# Altium footprint library modules.PcbLib: 20 footprints (part 1 of 2)
Each footprint in its own frame and in the unit in brackets; x right, y up, seen from the top. Pads: shape width x height; smd on the part's side, far side on the other; paste and mask are expansions set on the pad; w line width, h text height; cw(c..) or ccw(c..) is an arc to the next point about the centre after c.
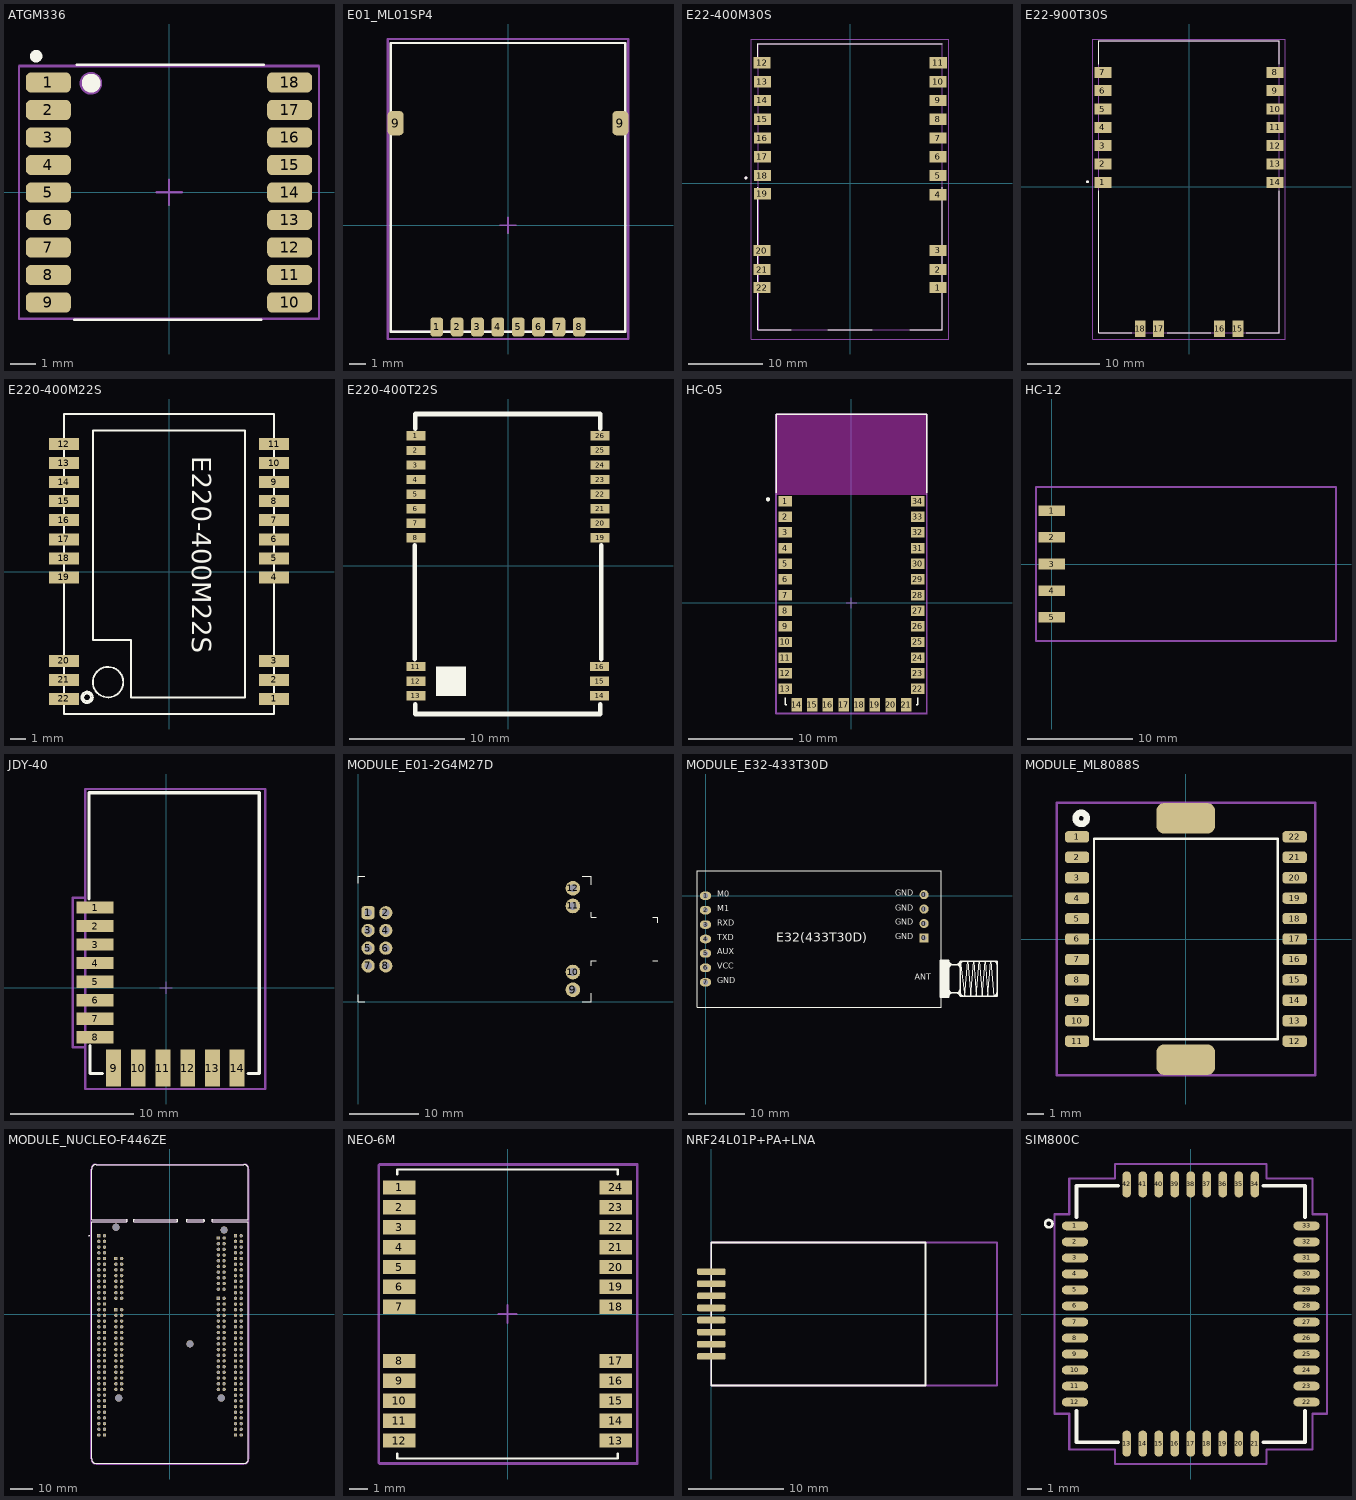
[diagram p0: the footprints below, top view; thin cyan lines are the x and y axes]

## ATGM336 [mm] "PQFN, 18-Leads, Body 9,70x10,10mm, Pitch 1,10mm, IPC Low Density"
height 2.6
pads (18):
  rrect50% 1.8x0.8 smd: 1(-4.825,4.4) 2(-4.825,3.3) 3(-4.825,2.2) 4(-4.825,1.1) 5(-4.825,0) 6(-4.825,-1.1) 7(-4.825,-2.2) 8(-4.825,-3.3) 9(-4.825,-4.4) 10(4.825,-4.4) 11(4.825,-3.3) 12(4.825,-2.2) 13(4.825,-1.1) 14(4.825,0) 15(4.825,1.1) 16(4.825,2.2) 17(4.825,3.3) 18(4.825,4.4)
Top Overlay:
  circle w0.25: c-5.315,5.45 r0.125
  circle w0.5: c-3.113,4.371 r0.125
  lines w0.1: -3.8,-5.1 3.7,-5.1 ; -3.7,5.1 3.8,5.1
Top Assembly (Mech13):
  circle w0.5: c-3.124,4.366 r0.2
  lines w0.1: -0.5,0 0.5,0 ; 0,-0.5 0,0.5 ; -6,-5.05 -6,5.05 6,5.05 6,-5.05 -6,-5.05
Top Courtyard (Mech15):
  lines w0.05: -6,-5.05 -6,5.1 6,5.1 6,-5.05 -6,-5.05
3D body "ATGM336H.stp": height 2.6, standoff 0, extent -4.85,-5.05 4.85,5.05

## E01_ML01SP4 [mm]
pads (10):
  rrect50% 0.8x1.2 smd mask+0: 1(-4.445,-6.35) 2(-3.175,-6.35) 3(-1.905,-6.35) 4(-0.635,-6.35) 5(0.635,-6.35) 6(1.905,-6.35) 7(3.175,-6.35) 8(4.445,-6.35)
  rrect50% 1x1.5 smd mask+0: 9(-7,6.35) 9(7,6.35)
Top Overlay:
  lines w0.15: -7.3,-6.65 7.3,-6.65 7.3,11.35 -7.3,11.35 -7.3,-6.65
Top Assembly (Mech13):
  lines w0.1: -0.5,0 0.5,0 ; 0,-0.5 0,0.5
  lines w0.15: -7.3,-6.65 7.3,-6.65 7.3,11.35 -7.3,11.35 -7.3,-6.65
Top Courtyard (Mech15):
  lines w0.15: -7.5,-7.1 7.5,-7.1 7.5,11.6 -7.5,11.6 -7.5,-7.1

## E22-400M30S [mm]
pads (22):
  rect 2.31x1.51 smd: 1(11.92,-14.15) 2(11.92,-11.72) 3(11.9,-9.11) 20(-11.94,-9.13) 21(-11.91,-11.7) 22(-11.91,-14.15)
  rect 2.34x1.53 smd: 4(11.905,-1.58) 5(11.905,1.02) 6(11.905,3.56) 7(11.905,6.1) 8(11.905,8.64) 9(11.905,11.18) 10(11.905,13.72) 11(11.915,16.29) 12(-11.915,16.29) 13(-11.865,13.72) 14(-11.865,11.18) 15(-11.865,8.64) 16(-11.865,6.1) 17(-11.865,3.56) 18(-11.865,1.02) 19(-11.865,-1.45)
Top Overlay:
  circle w0.2: c-14.1,0.7 r0.1
  lines w0.127: -12.5,-0.55 -12.5,-19.85 -7.95,-19.85 ; -12.5,17 -12.5,18.85 12.5,18.85 ; -3,-19.85 3,-19.85 ; 8.05,-19.85 12.5,-19.85 12.5,-0.55
Top Assembly (Mech13):
  circle w0.2: c-14.1,0.7 r0.1
  lines w0.127: -12.5,18.85 -12.4,-19.85 12.5,-19.85 12.5,18.85 -12.5,18.85
Top Courtyard (Mech15):
  lines w0.05: -13.36,-21.105 -13.36,19.5 13.36,19.5 13.36,-21.105 -13.36,-21.105

## E22-900T30S [mm]
pads (18):
  rect 2.34x1.53 smd: 1(-11.935,0.63) 2(-11.935,3.17) 3(-11.935,5.71) 4(-11.935,8.25) 5(-11.935,10.79) 6(-11.935,13.33) 7(-11.935,15.87) 8(11.935,15.87) 9(11.935,13.33) 10(11.935,10.79) 11(11.935,8.25) 12(11.935,5.71) 13(11.935,3.17) 14(11.935,0.63)
  rect 1.51x2.31 smd: 15(6.77,-19.7) 16(4.23,-19.7) 17(-4.23,-19.7) 18(-6.77,-19.7)
Top Overlay:
  circle w0.2: c-14.1,0.7 r0.1
  lines w0.127: -12.5,-0.55 -12.5,-20.25 -7.95,-20.25 ; -12.5,17 -12.5,20.25 12.5,20.25 12.5,17 ; -3,-20.25 3,-20.25 ; 7.95,-20.25 12.5,-20.25 12.5,-0.55
Top Assembly (Mech13):
  circle w0.2: c-14.1,0.7 r0.1
  lines w0.127: -12.5,-20.25 12.5,-20.25 12.5,20.25 -12.5,20.25 -12.5,-20.25
Top Courtyard (Mech15):
  lines w0.05: -13.36,-21.105 13.36,-21.105 13.36,20.5 -13.36,20.5 -13.36,-21.105
3D body "User Library-E32_XXXT30S Ebyte.STEP": height 3.83, standoff -0.02, extent -12.5,-20.25 12.5,20.25

## E220-400M22S [mm]
pads (22):
  rect 2x0.8 smd: 1(7,-8.5) 2(7,-7.23) 3(7,-5.96) 4(7,-0.39) 5(7,0.88) 6(7,2.15) 7(7,3.42) 8(7,4.69) 9(7,5.96) 10(7,7.23) 11(7,8.5) 12(-7,8.5) 13(-7,7.23) 14(-7,5.96) 15(-7,4.69) 16(-7,3.42) 17(-7,2.15) 18(-7,0.88) 19(-7,-0.39) 20(-7,-5.96) 21(-7,-7.23) 22(-7,-8.5)
Top Overlay:
  circle w0.127: c-4.064,-7.374 r1.016
  circle w0.127: c-5.461,-8.39 r0.381
  circle w0.127: c-5.461,-8.39 r0.254
  lines w0.127: -7,-9.5 7,-9.5 7,10.5 -7,10.5 -7,-9.5 ; -5.08,-4.58 -2.54,-4.58 -2.54,-8.39 5.08,-8.39 5.08,9.39 -5.08,9.39 -5.08,-4.58
  text "E220-400M22S" at 1.538,7.678 h1.27

## E220-400T22S [mil]
pads (22):
  rect 66x32 smd: 1(-315.94,445.81) 2(-315.94,395.81) 3(-315.94,345.81) 4(-315.94,295.81) 5(-315.94,245.81) 6(-315.94,195.81) 7(-315.94,145.81) 8(-315.94,95.81) 11(-315.83,-345.81) 12(-315.83,-395.81) 13(-315.83,-445.81) 14(314.17,-445.81) 15(314.17,-395.81) 16(314.17,-345.81) 19(315.94,95.81) 20(315.94,145.81) 21(315.94,195.81) 22(315.94,245.81) 23(315.94,295.81) 24(315.94,345.81) 25(315.94,395.81) 26(315.94,445.81)
Top Overlay:
  region: -245.83,-345.81 -145.83,-345.81 -145.83,-445.81 -245.83,-445.81
  lines w15.75: -320,-320 -320,70 ; -318.78,-475.81 -318.78,-508.59 316.6,-508.59 316.6,-475.81 ; -318.52,470 -318.52,520.82 316.96,520.82 316.96,469.63 ; 320,-320 320,70
3D body "User Library-E22-900T22.STEP": height 124.41, standoff -0.39, extent -312.91,-499.45 317.01,524.18

## HC-05 [mm]
pads (34):
  rect 1.3x1 smd: 1(-6.35,9.75) 2(-6.35,8.25) 3(-6.35,6.75) 4(-6.35,5.25) 5(-6.35,3.75) 6(-6.35,2.25) 7(-6.35,0.75) 8(-6.35,-0.75) 9(-6.35,-2.25) 10(-6.35,-3.75) 11(-6.35,-5.25) 12(-6.35,-6.75) 13(-6.35,-8.25) 22(6.35,-8.25) 23(6.35,-6.75) 24(6.35,-5.25) 25(6.35,-3.75) 26(6.35,-2.25) 27(6.35,-0.75) 28(6.35,0.75) 29(6.35,2.25) 30(6.35,3.75) 31(6.35,5.25) 32(6.35,6.75) 33(6.35,8.25) 34(6.35,9.75)
  rect 1x1.3 smd: 14(-5.25,-9.75) 15(-3.75,-9.75) 16(-2.25,-9.75) 17(-0.75,-9.75) 18(0.75,-9.75) 19(2.25,-9.75) 20(3.75,-9.75) 21(5.25,-9.75)
Top Overlay:
  circle w0.2: c-8,9.925 r0.1
  lines w0.127: -7.2,10.57 -7.2,18.1 7.2,18.1 7.2,10.57 ; -6.35,-9.07 -6.35,-9.75 -6.22,-9.75 ; 6.22,-9.75 6.35,-9.75 6.35,-9.07
Keep-Out Layer:
  region: 6.35,10.375 -6.35,10.375 -6.35,17.275 6.35,17.275
  region: 6.35,10.375 -6.35,10.375 -6.35,17.275 6.35,17.275
  region: 7.2,10.375 -7.2,10.375 -7.2,18.1 7.2,18.1
Top Assembly (Mech13):
  lines w0.1: -0.5,0 0.5,0 ; 0,-0.5 0,0.5
  lines w0.127: -7.2,-10.6 -7.2,18.1 7.2,18.1 7.2,-10.6 -7.2,-10.6
Top Courtyard (Mech15):
  lines w0.1: -7.25,-10.65 -7.25,18.1 7.25,18.1 7.25,-10.65 -7.25,-10.65
3D body "User Library-Bluetooth HC-06_.STEP": height 2.35, standoff 0, extent -7.01,-10.025 7.01,17.985

## HC-12 [mm]
pads (5):
  rect 2.5x1 smd: 1(0,5.08) 2(0,2.54) 3(0,0) 4(0,-2.54) 5(0,-5.08)
Top Assembly (Mech13):
  lines w0.1: -0.5,0 0.5,0 ; 0,-0.5 0,0.5
  lines w0.2: -1.5,-7.3 27,-7.3 27,7.3 -1.5,7.3 -1.5,-7.3
Top Courtyard (Mech15):
  lines w0.2: -1.5,-7.3 -1.5,7.3 27,7.3 27,-7.3 -1.5,-7.3
3D body: height 2, standoff 0, extent -0.762,-7.3 27,7.3

## JDY-40 [mm]
pads (14):
  rect 3x1 smd: 1(-5.75,6.5) 2(-5.75,5) 3(-5.75,3.5) 4(-5.75,2) 5(-5.75,0.5) 6(-5.75,-1) 7(-5.75,-2.5) 8(-5.75,-4)
  rect 1.2x3 smd: 9(-4.25,-6.5) 10(-2.25,-6.5) 11(-0.25,-6.5) 12(1.75,-6.5) 13(3.75,-6.5) 14(5.75,-6.5)
Top Overlay:
  lines w0.254: -6.25,7.2 -6.25,15.8 7.55,15.8 7.55,-6.95 6.65,-6.95 ; -6.15,-4.7 -6.15,-6.95 ; -5.15,-6.95 -6.15,-6.95 ; -6.15,-6.95 -6.15,-6.95
Top Assembly (Mech13):
  lines w0.1: -0.5,0 0.5,0 ; 0,-0.5 0,0.5
  lines w0.2: -6.558,-8.2 8.042,-8.2 8.042,16.1 -6.558,16.1 -6.558,-8.2
Top Courtyard (Mech15):
  lines w0.2: -7.57,-4.8 -7.57,7.3 -6.558,7.3 -6.558,16.1 8.042,16.1 8.042,-8.2 -6.558,-8.2 -6.558,-4.8 -7.57,-4.8
3D body "JDY-40.stp": height 1.1, standoff 0, extent -6.15,-7.05 7.55,16.05

## MODULE_E01-2G4M27D [mm]
height 8
pads (12):
  rrect50% 1.9x1.9 hole 1.1: 1(1.45,12.77)
  round 1.9 hole 1.1: 2(3.99,12.77) 3(1.45,10.23) 4(3.99,10.23) 5(1.45,7.69) 6(3.99,7.69) 7(1.45,5.15) 8(3.99,5.15)
  round 2.1 hole 1.1: 9(30.8,1.725) 10(30.8,4.265) 11(30.8,13.735) 12(30.8,16.275)
Top Overlay:
  lines w0.152: 0,1 0,0 1,0 ; 0,17 0,18 1,18 ; 32.15,0 33.4,0 33.4,1.25 ; 32.15,18 33.4,18 33.4,16.75 ; 33.4,5.15 33.4,5.9 34.15,5.9 ; 33.4,12.85 33.4,12.1 34.15,12.1 ; 42.25,5.9 43,5.9 ; 42.25,12.1 43,12.1 43,11.35
3D body: height 4.01, standoff 2.99, extent 30.006,15.477 31.6,17.074
3D body: height 4.01, standoff 2.99, extent 30.006,12.937 31.6,14.534
3D body: height 4.01, standoff 2.99, extent 30.006,3.467 31.6,5.064
3D body: height 4.01, standoff 2.99, extent 30.006,0.927 31.6,2.524
3D body: height 4.01, standoff 2.99, extent 3.196,6.892 4.79,8.489
3D body: height 4.01, standoff 2.99, extent 3.196,9.432 4.79,11.029
3D body: height 4.01, standoff 2.99, extent 3.206,11.972 4.8,13.569
3D body: height 4.01, standoff 2.99, extent 0.656,11.972 2.25,13.569
3D body: height 4.01, standoff 2.99, extent 0.656,9.432 2.25,11.029
3D body: height 4.01, standoff 2.99, extent 0.656,6.892 2.25,8.489
3D body: height 4.01, standoff 2.99, extent 3.196,4.352 4.79,5.949
3D body: height 4.01, standoff 2.99, extent 0.656,4.352 2.25,5.949
3D body: height 5, standoff -1, extent 30.55,16.025 31.05,16.525
3D body: height 5, standoff -1, extent 30.55,13.485 31.05,13.985
3D body: height 5, standoff -1, extent 30.55,4.015 31.05,4.515
3D body: height 5, standoff -1, extent 30.55,1.475 31.05,1.975
3D body: height 5, standoff -1, extent 1.2,12.52 1.7,13.02
3D body: height 5, standoff -1, extent 3.74,12.52 4.24,13.02
3D body: height 5, standoff -1, extent 3.74,9.98 4.24,10.48
3D body: height 5, standoff -1, extent 1.2,9.98 1.7,10.48
3D body: height 5, standoff -1, extent 1.2,7.44 1.7,7.94
3D body: height 5, standoff -1, extent 3.74,7.44 4.24,7.94
3D body: height 5, standoff -1, extent 3.74,4.9 4.24,5.4
3D body: height 5, standoff -1, extent 1.2,4.9 1.7,5.4
3D body "wireless Module.stp": height 6.65, standoff -3.4, extent 0.054,-0.073 43.104,17.977

## MODULE_E32-433T30D [mm] "43MM*24mm-D//SMAі¤¶И12.5mm"
pads (11):
  rect 1.6x1.6 hole 0.9: 0(38.5,-7.43)
  round 1.6 hole 0.9: 0(38.5,-4.89) 0(38.5,-2.35) 0(38.5,0.19)
  oval 2x1.5 hole 0.9: 1(0,0) 2(0,-2.54) 3(0,-5.08) 4(0,-7.62) 5(0,-10.16) 6(0,-12.7) 7(0,-15.24)
Top Overlay:
  rectangle: 41.35,-17.87 42.85,-11.37
  lines w0.1: 45.7,-17.72 46.22,-11.52 ; 45.7,-17.72 44.85,-11.52 45.7,-17.72 ; 45.7,-17.72 46.22,-11.52 ; 46.22,-11.52 46.73,-17.72 ; 46.22,-11.52 46.73,-17.72 ; 46.73,-17.72 47.24,-11.52 ; 46.73,-17.72 47.24,-11.52 ; 47.24,-11.52 47.72,-17.72 ; 47.24,-11.52 47.72,-17.72 ; 47.72,-17.72 48.24,-11.52 ; 47.72,-17.72 48.24,-11.52 ; 48.24,-11.52 48.75,-17.72 ; 48.24,-11.52 48.75,-17.72 ; 48.75,-17.72 49.24,-11.52 ; 48.75,-17.72 49.24,-11.52 ; 49.24,-11.52 49.76,-17.72 ; 49.24,-11.52 49.76,-17.72 ; 49.76,-17.72 50.28,-11.52 ; 49.76,-17.72 50.28,-11.52 ; 50.28,-11.52 50.79,-17.72 50.28,-11.52 ; -1.5,-19.62 41.5,-19.62 41.5,4.38 -1.5,4.38 -1.5,-19.62
  lines w0.254: 41.35,-17.87 42.85,-17.87 ; 41.35,-17.87 41.35,-11.37 ; 41.35,-17.87 42.85,-17.87 ; 41.35,-17.87 41.35,-11.37 ; 41.35,-11.37 42.85,-11.37 ; 41.35,-11.37 42.85,-11.37 ; 42.85,-17.87 42.85,-11.37 ; 42.85,-17.87 42.85,-11.37 ; 42.85,-16.47 ccw(c43.5,-16.47) 43.5,-17.12 ; 42.85,-16.47 ccw(c43.5,-16.47) 43.5,-17.12 ; 42.85,-16.47 42.85,-16.1 42.85,-16.47 ; 42.85,-12.82 cw(c43.55,-12.82) 43.55,-12.12 ; 42.85,-12.82 cw(c43.55,-12.82) 43.55,-12.12 ; 42.85,-12.82 42.85,-13.74 42.85,-12.82 ; 42.85,-11.49 ccw(c43.48,-11.49) 43.48,-12.12 ; 42.85,-11.49 ccw(c43.48,-11.49) 43.48,-12.12 ; 42.85,-11.49 42.85,-11.37 ; 42.85,-11.49 42.85,-11.37 ; 43.4,-17.12 ccw(c43.4,-17.67) 42.85,-17.67 cw(c43.4,-17.67) 43.4,-17.12 ; 43.4,-17.12 44.25,-17.12 ; 43.4,-17.12 44.25,-17.12 ; 43.48,-12.12 44.25,-12.12 ; 43.48,-12.12 44.25,-12.12 ; 43.5,-17.12 44.22,-17.12 ; 43.5,-17.12 44.22,-17.12 ; 43.55,-12.12 44.25,-12.12 ; 43.55,-12.12 44.25,-12.12 ; 44.22,-17.12 ccw(c44.22,-16.49) 44.85,-16.49 cw(c44.22,-16.49) 44.22,-17.12 ; 44.25,-17.12 cw(c44.25,-17.72) 44.85,-17.72 ; 44.25,-17.12 cw(c44.25,-17.72) 44.85,-17.72 ; 44.25,-12.12 cw(c44.25,-12.72) 44.85,-12.72 ccw(c44.25,-12.72) 44.25,-12.12 ; 44.25,-12.12 ccw(c44.25,-11.52) 44.85,-11.52 ; 44.25,-12.12 ccw(c44.25,-11.52) 44.85,-11.52 ; 44.85,-17.72 44.85,-11.52 ; 44.85,-17.72 51.35,-17.72 ; 44.85,-17.72 44.85,-11.52 ; 44.85,-17.72 51.35,-17.72 ; 44.85,-11.52 51.35,-11.52 ; 44.85,-11.52 51.35,-11.52 ; 45.53,-17.72 cw(c45.53,-17.04) 44.85,-17.04 ccw(c45.53,-17.04) 45.53,-17.72 ; 45.53,-17.72 45.68,-17.72 45.53,-17.72 ; 50.73,-17.72 ccw(c50.73,-17.1) 51.35,-17.1 cw(c50.73,-17.1) 50.73,-17.72 ; 50.73,-17.72 50.5,-17.72 50.73,-17.72 ; 50.81,-11.52 cw(c50.81,-12.06) 51.35,-12.06 ccw(c50.81,-12.06) 50.81,-11.52 ; 50.81,-11.52 50.41,-11.52 50.81,-11.52 ; 51.35,-17.72 51.35,-11.52 ; 51.35,-17.72 51.35,-11.52 ; 42.68,-17.12 44.85,-17.12 42.68,-17.12 ; 42.85,-12.12 44.85,-12.12 42.85,-12.12 ; 44.85,-12.13 cw(c45.46,-12.13) 45.46,-11.52 ccw(c45.46,-12.13) 44.85,-12.13
  text "E32(433T30D)" at 12.446,-8.763 h2.8
  text "ANT" at 36.83,-15.19 h1.8
  text "M0" at 2.063,-0.54 h1.8
  text "M1" at 2.063,-3.08 h1.8
  text "RXD" at 2.063,-5.62 h1.8
  text "TXD" at 2.063,-8.16 h1.8
  text "AUX" at 2.063,-10.7 h1.8
  text "VCC" at 2.063,-13.24 h1.8
  text "GND" at 2.063,-15.78 h1.8
  text "GND" at 33.426,-5.429 h1.8
  text "GND" at 33.426,-3.016 h1.8
  text "GND" at 33.457,-0.381 h1.8
  text "GND" at 33.457,-8.001 h1.8
3D body "e32-433t30d.STEP": height 8, standoff -5.51, extent -1.445,-19.62 51.055,4.38

## MODULE_ML8088S [mm]
pads (24):
  rrect50% 1.5x0.7 smd: 1(-6.762,6.35) 2(-6.762,5.08) 3(-6.762,3.81) 4(-6.762,2.54) 5(-6.762,1.27) 6(-6.762,0) 7(-6.762,-1.27) 8(-6.762,-2.54) 9(-6.762,-3.81) 10(-6.762,-5.08) 11(-6.762,-6.35) 12(6.763,-6.35) 13(6.763,-5.08) 14(6.763,-3.81) 15(6.763,-2.54) 16(6.763,-1.27) 17(6.763,0) 18(6.763,1.27) 19(6.763,2.54) 20(6.763,3.81) 21(6.763,5.08) 22(6.763,6.35)
  rrect50% 3.65x1.9 smd: ""(-0.012,-7.5) ""(-0.012,7.5)
Top Overlay:
  circle w0.4: c-6.512,7.5 r0.35
  lines w0.152: -5.715,-6.223 5.715,-6.223 5.715,6.223 -5.715,6.223 -5.715,-6.223
Top Assembly (Mech13):
  lines w0.152: -8.022,-8.46 8.03,-8.46 8.03,8.457 -8.022,8.457 -8.022,-8.46
3D body "User Library-ML8088S.STEP": height 2.8, standoff 0, extent -6.513,-7.514 6.487,7.486

## MODULE_NUCLEO-F446ZE [mm]
pads (249):
  rect 1.53x1.53 hole 1.02: CN7_1(21.59,33.914) CN8_1(-24.13,24.77) CN9_1(-24.13,1.91) CN10_1(21.59,6.99) CN11_1(-31.75,34.93) CN12_1(29.21,34.91)
  round 1.53 hole 1.02: CN7_2(24.13,33.914) CN7_3(21.59,31.374) CN7_4(24.13,31.374) CN7_5(21.59,28.834) CN7_6(24.13,28.834) CN7_7(21.59,26.294) CN7_8(24.13,26.294) CN7_9(21.59,23.754) CN7_10(24.13,23.754) CN7_11(21.59,21.214) CN7_12(24.13,21.214) CN7_13(21.59,18.674) CN7_14(24.13,18.674) CN7_15(21.59,16.134) CN7_16(24.13,16.134) CN7_17(21.59,13.594) CN7_18(24.13,13.594) CN7_19(21.59,11.054) CN7_20(24.13,11.054) CN8_2(-21.59,24.77) CN8_3(-24.13,22.23) CN8_4(-21.59,22.23) CN8_5(-24.13,19.69) CN8_6(-21.59,19.69) CN8_7(-24.13,17.15) CN8_8(-21.59,17.15) CN8_9(-24.13,14.61) CN8_10(-21.59,14.61) CN8_11(-24.13,12.07) CN8_12(-21.59,12.07) CN8_13(-24.13,9.53) CN8_14(-21.59,9.53) CN8_15(-24.13,6.99) CN8_16(-21.59,6.99) CN9_2(-21.59,1.91) CN9_3(-24.13,-0.63) CN9_4(-21.59,-0.63) CN9_5(-24.13,-3.17) CN9_6(-21.59,-3.17) CN9_7(-24.13,-5.71) CN9_8(-21.59,-5.71) CN9_9(-24.13,-8.25) CN9_10(-21.59,-8.25) CN9_11(-24.13,-10.79) CN9_12(-21.59,-10.79) CN9_13(-24.13,-13.33) CN9_14(-21.59,-13.33) CN9_15(-24.13,-15.87) CN9_16(-21.59,-15.87) CN9_17(-24.13,-18.41) CN9_18(-21.59,-18.41) CN9_19(-24.13,-20.95) CN9_20(-21.59,-20.95) CN9_21(-24.13,-23.49) CN9_22(-21.59,-23.49) CN9_23(-24.13,-26.03) CN9_24(-21.59,-26.03) CN9_25(-24.13,-28.57) CN9_26(-21.59,-28.57) CN9_27(-24.13,-31.11) CN9_28(-21.59,-31.11) CN9_29(-24.13,-33.65) CN9_30(-21.59,-33.65) CN10_2(24.13,6.99) CN10_3(21.59,4.45) CN10_4(24.13,4.45) CN10_5(21.59,1.91) CN10_6(24.13,1.91) CN10_7(21.59,-0.63) CN10_8(24.13,-0.63) CN10_9(21.59,-3.17) CN10_10(24.13,-3.17) CN10_11(21.59,-5.71) CN10_12(24.13,-5.71) CN10_13(21.59,-8.25) CN10_14(24.13,-8.25) CN10_15(21.59,-10.79) CN10_16(24.13,-10.79) CN10_17(21.59,-13.33) CN10_18(24.13,-13.33) CN10_19(21.59,-15.87) CN10_20(24.13,-15.87) CN10_21(21.59,-18.41) CN10_22(24.13,-18.41) CN10_23(21.59,-20.95) CN10_24(24.13,-20.95) CN10_25(21.59,-23.49) CN10_26(24.13,-23.49) CN10_27(21.59,-26.03) CN10_28(24.13,-26.03) CN10_29(21.59,-28.57) CN10_30(24.13,-28.57) CN10_31(21.59,-31.11) CN10_32(24.13,-31.11) CN10_33(21.59,-33.65) CN10_34(24.13,-33.65) CN11_2(-29.21,34.93) CN11_3(-31.75,32.39) CN11_4(-29.21,32.39) CN11_5(-31.75,29.85) CN11_6(-29.21,29.85) CN11_7(-31.75,27.31) CN11_8(-29.21,27.31) CN11_9(-31.75,24.77) CN11_10(-29.21,24.77) CN11_11(-31.75,22.23) CN11_12(-29.21,22.23) CN11_13(-31.75,19.69) CN11_14(-29.21,19.69) CN11_15(-31.75,17.15) CN11_16(-29.21,17.15) CN11_17(-31.75,14.61) CN11_18(-29.21,14.61) CN11_19(-31.75,12.07) CN11_20(-29.21,12.07) CN11_21(-31.75,9.53) CN11_22(-29.21,9.53) CN11_23(-31.75,6.99) CN11_24(-29.21,6.99) CN11_25(-31.75,4.45) CN11_26(-29.21,4.45) CN11_27(-31.75,1.91) CN11_28(-29.21,1.91) CN11_29(-31.75,-0.63) CN11_30(-29.21,-0.63) CN11_31(-31.75,-3.17) CN11_32(-29.21,-3.17) CN11_33(-31.75,-5.71) CN11_34(-29.21,-5.71) CN11_35(-31.75,-8.25) CN11_36(-29.21,-8.25) CN11_37(-31.75,-10.79) CN11_38(-29.21,-10.79) CN11_39(-31.75,-13.33) CN11_40(-29.21,-13.33) CN11_41(-31.75,-15.87) CN11_42(-29.21,-15.87) CN11_43(-31.75,-18.41) CN11_44(-29.21,-18.41) CN11_45(-31.75,-20.95) CN11_46(-29.21,-20.95) CN11_47(-31.75,-23.49) CN11_48(-29.21,-23.49) CN11_49(-31.75,-26.03) CN11_50(-29.21,-26.03) CN11_51(-31.75,-28.57) CN11_52(-29.21,-28.57) CN11_53(-31.75,-31.11) CN11_54(-29.21,-31.11) CN11_55(-31.75,-33.65) CN11_56(-29.21,-33.65) CN11_57(-31.75,-36.19) CN11_58(-29.21,-36.19) CN11_59(-31.75,-38.73) CN11_60(-29.21,-38.73) CN11_61(-31.75,-41.27) CN11_62(-29.21,-41.27) CN11_63(-31.75,-43.81) CN11_64(-29.21,-43.81) CN11_65(-31.75,-46.35) CN11_66(-29.21,-46.35) CN11_67(-31.75,-48.89) CN11_68(-29.21,-48.89) CN11_69(-31.75,-51.43) CN11_70(-29.21,-51.43) CN11_71(-31.75,-53.97) CN11_72(-29.21,-53.97) CN12_2(31.75,34.91) CN12_3(29.21,32.37) CN12_4(31.75,32.37) CN12_5(29.21,29.83) CN12_6(31.75,29.83) CN12_7(29.21,27.29) CN12_8(31.75,27.29) CN12_9(29.21,24.75) CN12_10(31.75,24.75) CN12_11(29.21,22.21) CN12_12(31.75,22.21) CN12_13(29.21,19.67) CN12_14(31.75,19.67) CN12_15(29.21,17.13) CN12_16(31.75,17.13) CN12_17(29.21,14.59) CN12_18(31.75,14.59) CN12_19(29.21,12.05) CN12_20(31.75,12.05) CN12_21(29.21,9.51) CN12_22(31.75,9.51) CN12_23(29.21,6.97) CN12_24(31.75,6.97) CN12_25(29.21,4.43) CN12_26(31.75,4.43) CN12_27(29.21,1.89) CN12_28(31.75,1.89) CN12_29(29.21,-0.65) CN12_30(31.75,-0.65) CN12_31(29.21,-3.19) CN12_32(31.75,-3.19) CN12_33(29.21,-5.73) CN12_34(31.75,-5.73) CN12_35(29.21,-8.27) CN12_36(31.75,-8.27) CN12_37(29.21,-10.81) CN12_38(31.75,-10.81) CN12_39(29.21,-13.35) CN12_40(31.75,-13.35) CN12_41(29.21,-15.89) CN12_42(31.75,-15.89) CN12_43(29.21,-18.43) CN12_44(31.75,-18.43) CN12_45(29.21,-20.97) CN12_46(31.75,-20.97) CN12_47(29.21,-23.51) CN12_48(31.75,-23.51) CN12_49(29.21,-26.05) CN12_50(31.75,-26.05) CN12_51(29.21,-28.59) CN12_52(31.75,-28.59) CN12_53(29.21,-31.13) CN12_54(31.75,-31.13) CN12_55(29.21,-33.67) CN12_56(31.75,-33.67) CN12_57(29.21,-36.21) CN12_58(31.75,-36.21) CN12_59(29.21,-38.75) CN12_60(31.75,-38.75) CN12_61(29.21,-41.29) CN12_62(31.75,-41.29) CN12_63(29.21,-43.83) CN12_64(31.75,-43.83) CN12_65(29.21,-46.37) CN12_66(31.75,-46.37) CN12_67(29.21,-48.91) CN12_68(31.75,-48.91) CN12_69(29.21,-51.45) CN12_70(31.75,-51.45) CN12_71(29.21,-53.99) CN12_72(31.75,-53.99)
  round 3.2 hole 3.2 unplated: ""(-24.13,38.74) ""(-22.86,-37.46) ""(8.89,-13.33) ""(22.86,-37.46) ""(24.13,37.47)
Top Overlay:
  circle w0.2: c-36.04,34.93 r0.1
  lines w0.127: -19.507,41.17 -35,41.17 -35,-64.67 ccw(c-33,-64.67) -33,-66.67 33,-66.67 ccw(c33,-64.67) 35,-64.67 35,41.17 18.999,41.17 ; -19.507,42.11 -35,42.11 -35,64.67 cw(c-33,64.67) -33,66.67 33,66.67 cw(c33,64.67) 35,64.67 35,42.11 18.999,42.11 ; -19.506,41.17 ccw(c-19.515,41.64) -19.506,42.11 ; -16.003,41.17 cw(c-15.995,41.64) -16.003,42.11 ; -16.002,41.17 2.997,41.17 ; -16.002,42.11 2.997,42.11 ; 2.998,41.17 ccw(c2.99,41.64) 2.998,42.11 ; 7.619,41.17 cw(c7.627,41.64) 7.619,42.11 ; 7.62,41.17 14.935,41.17 ; 7.62,42.11 14.935,42.11 ; 14.936,41.17 ccw(c14.928,41.64) 14.936,42.11 ; 18.998,41.17 cw(c19.007,41.64) 18.998,42.11
Top Assembly (Mech13):
  circle w0.2: c-36.04,34.93 r0.1
  lines w0.127: -19.507,41.17 -35,41.17 -35,-64.67 ccw(c-33,-64.67) -33,-66.67 33,-66.67 ccw(c33,-64.67) 35,-64.67 35,41.17 18.999,41.17 ; -19.507,42.11 -35,42.11 -35,64.67 cw(c-33,64.67) -33,66.67 33,66.67 cw(c33,64.67) 35,64.67 35,42.11 18.999,42.11 ; -19.506,41.17 ccw(c-19.515,41.64) -19.506,42.11 ; -16.003,41.17 cw(c-15.995,41.64) -16.003,42.11 ; -16.002,41.17 2.997,41.17 ; -16.002,42.11 2.997,42.11 ; 2.998,41.17 ccw(c2.99,41.64) 2.998,42.11 ; 7.619,41.17 cw(c7.627,41.64) 7.619,42.11 ; 7.62,41.17 14.935,41.17 ; 7.62,42.11 14.935,42.11 ; 14.936,41.17 ccw(c14.928,41.64) 14.936,42.11 ; 18.998,41.17 cw(c19.007,41.64) 18.998,42.11
Top Courtyard (Mech15):
  lines w0.05: -35.25,-64.67 ccw(c-33,-64.67) -33,-66.92 33,-66.92 ccw(c33,-64.67) 35.25,-64.67 35.25,64.67 ccw(c33,64.67) 33,66.92 -33,66.92 ccw(c-33,64.67) -35.25,64.67 -35.25,-64.67

## NEO-6M [mm]
pads (24):
  rect 1.8x0.8 smd paste-2: 1(-6,7) 2(-6,5.9) 3(-6,4.8) 4(-6,3.7) 5(-6,2.6) 6(-6,1.5) 7(-6,0.4) 8(-6,-2.6) 9(-6,-3.7) 10(-6,-4.8) 11(-6,-5.9) 12(-6,-7) 13(6,-7) 14(6,-5.9) 15(6,-4.8) 16(6,-3.7) 17(6,-2.6) 18(6,0.4) 19(6,1.5) 20(6,2.6) 21(6,3.7) 22(6,4.8) 23(6,5.9) 24(6,7)
Top Overlay:
  lines w0.127: -6.1,-7.72 -6.1,-8 6.1,-8 6.1,-7.72 ; -6.1,7.72 -6.1,8 6.1,8 6.1,7.72
Top Assembly (Mech13):
  lines w0.1: -0.5,0 0.5,0 ; 0,-0.5 0,0.5 ; -7.1,-8.3 -7.1,8.3 7.2,8.3 7.2,-8.3 -7.1,-8.3
Top Courtyard (Mech15):
  lines w0.1: -7.15,-8.25 -7.15,8.25 7.15,8.25 7.15,-8.25 -7.15,-8.25
3D body "User Library-UBLOX_GPS_NEO-6M.STEP": height 2.64, standoff 0, extent -6.18,-8.3 6.18,8.3

## NRF24L01P+PA+LNA [mm]
pads (8):
  rrect50% 3x0.7 smd: 1(0,4.445) 2(0,3.175) 3(0,1.905) 4(0,0.635) 5(0,-0.635) 6(0,-1.905) 7(0,-3.175) 8(0,-4.445)
Top Overlay:
  lines w0.2: 0,-7.5 0,7.5 22.5,7.5 22.5,-7.5 0,-7.5
Top Assembly (Mech13):
  lines w0.2: 0,-7.5 30,-7.5 30,7.5 0,7.5 0,-7.5
3D body "User Library-nRF24L01-Mini.STEP": height 0.8, standoff 0, extent -0.094,-5.95 17.906,6.05

## SIM800C [mm]
pads (42):
  oval 1.8x0.6 smd: 1(-7.95,6.05) 2(-7.95,4.95) 3(-7.95,3.85) 4(-7.95,2.75) 5(-7.95,1.65) 6(-7.95,0.55) 7(-7.95,-0.55) 8(-7.95,-1.65) 9(-7.95,-2.75) 10(-7.95,-3.85) 11(-7.95,-4.95) 12(-7.95,-6.05) 22(7.95,-6.05) 23(7.95,-4.95) 24(7.95,-3.85) 25(7.95,-2.75) 26(7.95,-1.65) 27(7.95,-0.55) 28(7.95,0.55) 29(7.95,1.65) 30(7.95,2.75) 31(7.95,3.85) 32(7.95,4.95) 33(7.95,6.05)
  oval 0.6x1.8 smd: 13(-4.4,-8.9) 14(-3.3,-8.9) 15(-2.2,-8.9) 16(-1.1,-8.9) 17(0,-8.9) 18(1.1,-8.9) 19(2.2,-8.9) 20(3.3,-8.9) 21(4.4,-8.9) 34(4.4,8.9) 35(3.3,8.9) 36(2.2,8.9) 37(1.1,8.9) 38(0,8.9) 39(-1.1,8.9) 40(-2.2,8.9) 41(-3.3,8.9) 42(-4.4,8.9)
Top Overlay:
  circle w0.178: c-9.75,6.2 r0.254
  lines w0.254: -7.85,-6.65 -7.85,-8.8 -5,-8.8 ; -7.85,6.65 -7.85,8.8 -5,8.8 ; 5,-8.8 7.85,-8.8 7.85,-6.65 ; 5,8.8 7.85,8.8 7.85,6.65
Top Assembly (Mech13):
  lines w0.152: -9.35,-6.85 -8.35,-6.85 -8.35,-9.3 -5.2,-9.3 -5.2,-10.3 5.2,-10.3 5.2,-9.3 8.35,-9.3 8.35,-6.85 9.35,-6.85 9.35,6.85 8.35,6.85 8.35,9.3 5.2,9.3 5.2,10.3 -5.2,10.3 -5.2,9.3 -8.35,9.3 -8.35,6.85 -9.35,6.85 -9.35,-6.85
3D body "User Library-SIM800C-1.STEP": height 2.27, standoff -0.07, extent -7.833,-8.808 7.867,8.792